# Altium footprint library En.PcbLib: 157 footprints (part 10 of 10)
Each footprint in its own frame and in the unit in brackets; x right, y up, seen from the top. Pads: shape width x height; smd on the part's side, far side on the other; paste and mask are expansions set on the pad; w line width, h text height; cw(c..) or ccw(c..) is an arc to the next point about the centre after c.
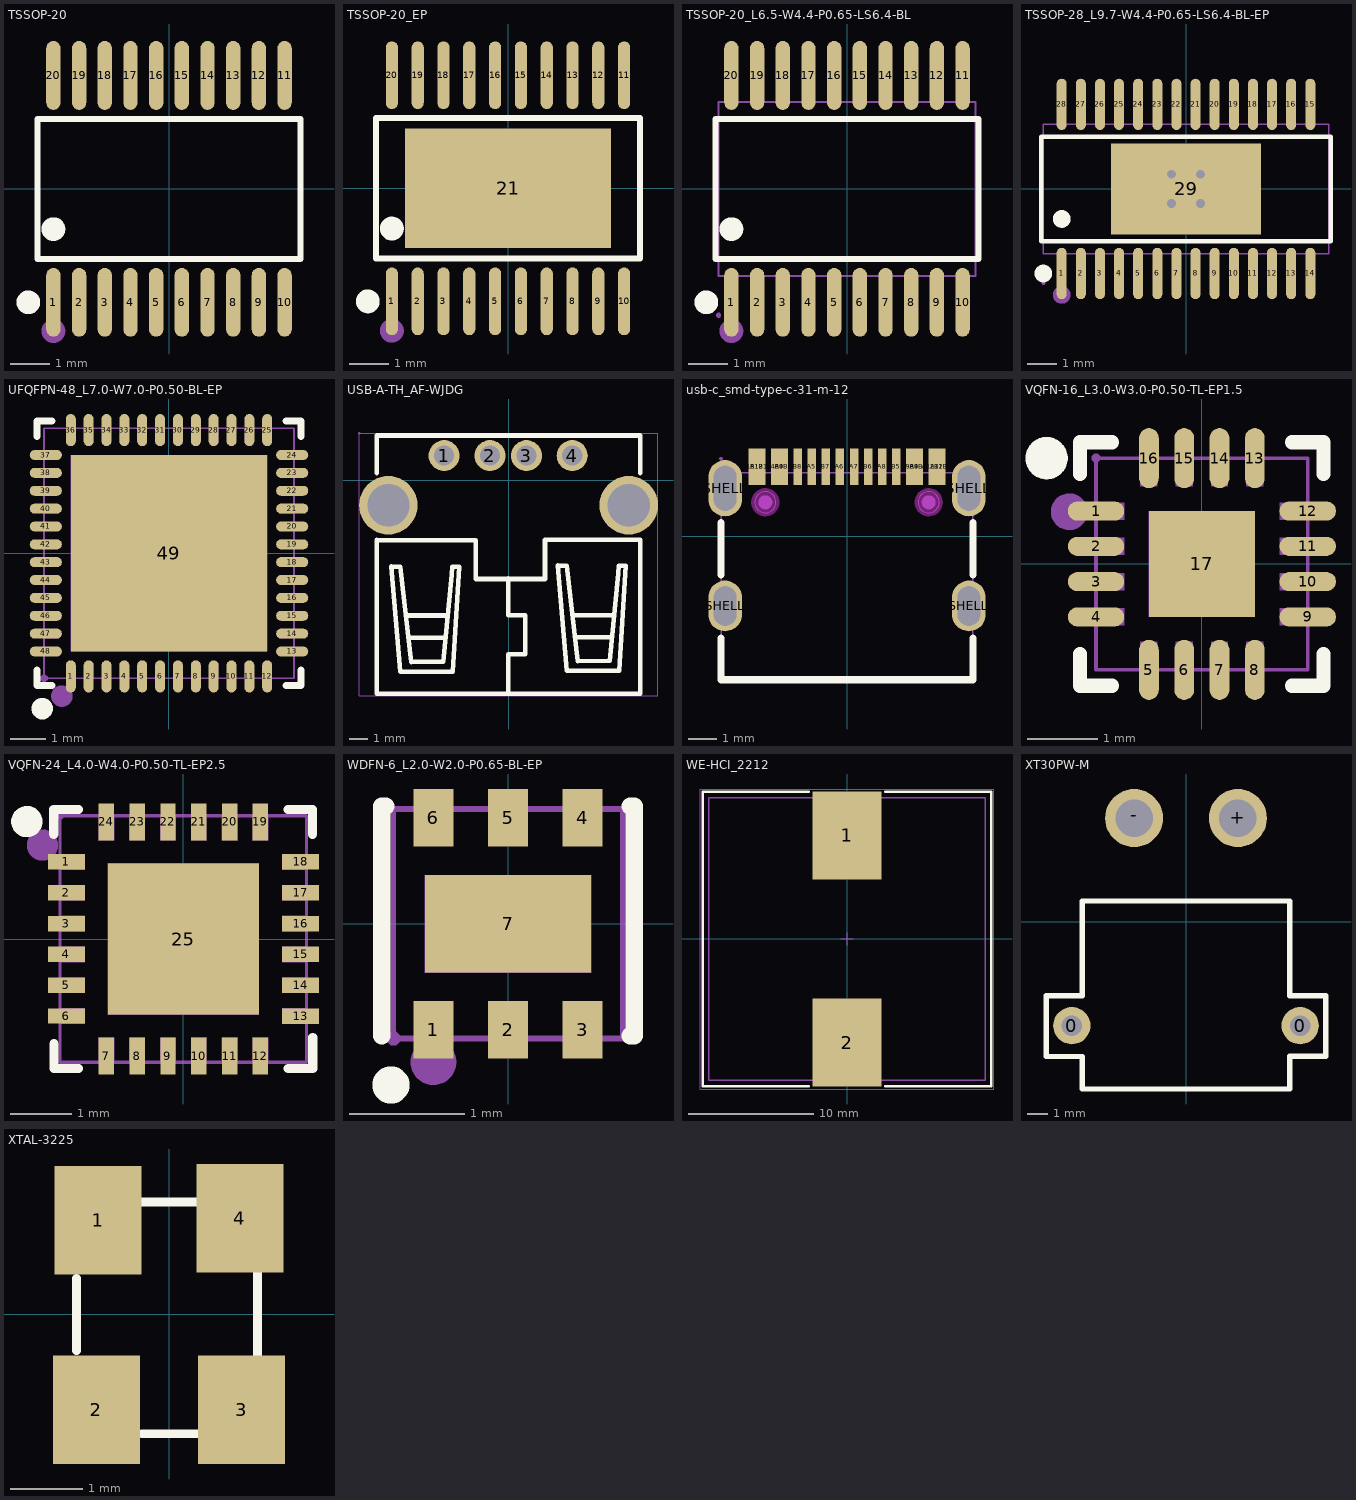
[diagram p9: the footprints below, top view; thin cyan lines are the x and y axes]

## TSSOP-20 [mm]
pads (20):
  oval 0.364x1.742 smd: 1(-2.925,-2.871) 2(-2.275,-2.871) 3(-1.625,-2.871) 4(-0.975,-2.871) 5(-0.325,-2.871) 6(0.325,-2.871) 7(0.975,-2.871) 8(1.625,-2.871) 9(2.275,-2.871) 10(2.925,-2.871) 11(2.925,2.871) 12(2.275,2.871) 13(1.625,2.871) 14(0.975,2.871) 15(0.325,2.871) 16(-0.325,2.871) 17(-0.975,2.871) 18(-1.625,2.871) 19(-2.275,2.871) 20(-2.925,2.871)
Top Overlay:
  circle w0.3: c-2.925,-1.019 r0.15
  circle w0.3: c-3.559,-2.871 r0.15
  lines w0.152: -3.326,-1.771 -3.326,1.771 3.326,1.771 3.326,-1.771 -3.326,-1.771
Mechanical 15:
  circle w0.3: c-2.925,-3.6 r0.15
3D body "User Library-tssop-20-1.SLDPRT": height 1.2, standoff 0, extent -3.3,-3.3 3.3,3.3

## TSSOP-20_EP [mm]
pads (21):
  oval 0.308x1.706 smd: 1(-2.925,-2.848) 2(-2.275,-2.848) 3(-1.625,-2.848) 4(-0.975,-2.848) 5(-0.325,-2.848) 6(0.325,-2.848) 7(0.975,-2.848) 8(1.625,-2.848) 9(2.275,-2.848) 10(2.925,-2.848) 11(2.925,2.848) 12(2.275,2.848) 13(1.625,2.848) 14(0.975,2.848) 15(0.325,2.848) 16(-0.325,2.848) 17(-0.975,2.848) 18(-1.625,2.848) 19(-2.275,2.848) 20(-2.925,2.848)
  rect 5.2x3 smd: 21(0,0)
Top Overlay:
  circle w0.3: c-2.925,-1.014 r0.15
  circle w0.3: c-3.531,-2.848 r0.15
  lines w0.152: -3.326,-1.766 -3.326,1.766 3.326,1.766 3.326,-1.766 -3.326,-1.766
Mechanical 15:
  circle w0.3: c-2.925,-3.587 r0.15
3D body "User Library-tssop-20-1.SLDPRT": height 1.2, standoff 0, extent -3.3,-3.3 3.3,3.3

## TSSOP-20_L6.5-W4.4-P0.65-LS6.4-BL [mm]
pads (20):
  oval 0.364x1.742 smd: 1(-2.925,-2.871) 2(-2.275,-2.871) 3(-1.625,-2.871) 4(-0.975,-2.871) 5(-0.325,-2.871) 6(0.325,-2.871) 7(0.975,-2.871) 8(1.625,-2.871) 9(2.275,-2.871) 10(2.925,-2.871) 11(2.925,2.871) 12(2.275,2.871) 13(1.625,2.871) 14(0.975,2.871) 15(0.325,2.871) 16(-0.325,2.871) 17(-0.975,2.871) 18(-1.625,2.871) 19(-2.275,2.871) 20(-2.925,2.871)
Top Overlay:
  circle w0.3: c-3.559,-2.871 r0.15
  circle w0.3: c-2.925,-1.019 r0.15
  lines w0.152: -3.326,-1.771 3.326,-1.771 3.326,1.771 -3.326,1.771 -3.326,-1.771
Mechanical 6:
  circle w0.3: c-2.925,-3.6 r0.15
Mechanical 15:
  drawing of 45 lines, arcs and shapes, not listed
3D body "User Library-tssop-20-1.SLDPRT": height 1.2, standoff 0, extent -3.3,-3.3 3.3,3.3

## TSSOP-28_L9.7-W4.4-P0.65-LS6.4-BL-EP [mm]
pads (29):
  oval 0.343x1.747 smd: 1(-4.225,-2.873) 2(-3.575,-2.873) 3(-2.925,-2.873) 4(-2.275,-2.873) 5(-1.625,-2.873) 6(-0.975,-2.873) 7(-0.325,-2.873) 8(0.325,-2.873) 9(0.975,-2.873) 10(1.625,-2.873) 11(2.275,-2.873) 12(2.925,-2.873) 13(3.575,-2.873) 14(4.225,-2.873) 15(4.225,2.873) 16(3.575,2.873) 17(2.925,2.873) 18(2.275,2.873) 19(1.625,2.873) 20(0.975,2.873) 21(0.325,2.873) 22(-0.325,2.873) 23(-0.975,2.873) 24(-1.625,2.873) 25(-2.275,2.873) 26(-2.925,2.873) 27(-3.575,2.873) 28(-4.225,2.873)
  rect 5.1x3.1 smd: 29(0,0)
via 0.5,0.5 diameter 0.61 hole 0.305
via -0.5,0.5 diameter 0.61 hole 0.305
via -0.5,-0.5 diameter 0.61 hole 0.305
via 0.5,-0.5 diameter 0.61 hole 0.305
Top Overlay:
  circle w0.3: c-4.225,-1.019 r0.15
  circle w0.3: c-4.849,-2.873 r0.15
  lines w0.152: -4.926,-1.771 -4.926,1.771 4.926,1.771 4.926,-1.771 -4.926,-1.771
Mechanical 6:
  circle w0.3: c-4.225,-3.6 r0.15
Mechanical 15:
  drawing of 62 lines, arcs and shapes, not listed
3D body "User Library-tssop28.SLDPRT": height 1.2, standoff 0, extent -4.9,-3.2 4.9,3.2

## UFQFPN-48_L7.0-W7.0-P0.50-BL-EP [mm]
pads (49):
  oval 0.28x0.9 smd: 1(-2.751,-3.449) 2(-2.25,-3.449) 3(-1.75,-3.449) 4(-1.25,-3.449) 5(-0.749,-3.449) 6(-0.249,-3.449) 7(0.249,-3.449) 8(0.749,-3.449) 9(1.25,-3.449) 10(1.75,-3.449) 11(2.251,-3.449) 12(2.751,-3.449) 25(2.751,3.449) 26(2.251,3.449) 27(1.75,3.449) 28(1.25,3.449) 29(0.749,3.449) 30(0.249,3.449) 31(-0.249,3.449) 32(-0.749,3.449) 33(-1.25,3.449) 34(-1.75,3.449) 35(-2.25,3.449) 36(-2.751,3.449)
  oval 0.9x0.28 smd: 13(3.449,-2.751) 14(3.449,-2.251) 15(3.449,-1.75) 16(3.449,-1.25) 17(3.449,-0.749) 18(3.449,-0.249) 19(3.449,0.249) 20(3.449,0.749) 21(3.449,1.25) 22(3.449,1.75) 23(3.449,2.25) 24(3.449,2.751) 37(-3.449,2.751) 38(-3.449,2.25) 39(-3.449,1.75) 40(-3.449,1.25) 41(-3.449,0.749) 42(-3.449,0.249) 43(-3.449,-0.249) 44(-3.449,-0.749) 45(-3.449,-1.25) 46(-3.449,-1.75) 47(-3.449,-2.251) 48(-3.449,-2.751)
  rect 5.5x5.5 smd: 49(0,0)
Top Overlay:
  lines w0.2: -3.7,-3.275 -3.7,-3.7 -3.275,-3.7 ; -3.7,3.275 -3.7,3.7 -3.275,3.7 ; 3.275,-3.7 3.7,-3.7 3.7,-3.275 ; 3.275,3.7 3.7,3.7 3.7,3.275
  lines w0.3: -3.551,-4.201 ccw(c-3.55,-4.351) -3.55,-4.501 ccw(c-3.55,-4.351) -3.548,-4.201
Mechanical 6:
  circle w0.3: c-3,-4 r0.15
Mechanical 15:
  drawing of 54 lines, arcs and shapes, not listed
3D body "stm32g431cbu6.step": height 0.61, standoff 0, extent -3.512,-3.51 3.515,3.517

## USB-A-TH_AF-WJDG [mm]
pads (6):
  round 1.7 hole 1.1: 1(-3.52,1.355) 2(-1.019,1.355) 3(0.98,1.355) 4(3.48,1.355)
  round 3.2 hole 2.3: ""(-6.57,-1.355) ""(6.57,-1.355)
Top Overlay:
  lines w0.254: -7.199,-3.236 -7.199,-11.655 7.201,-11.655 7.201,-3.236 ; -7.199,0.404 -7.199,2.46 7.201,2.46 7.201,0.404 ; -7.19,-3.266 -1.79,-3.266 -1.79,-5.385 1.99,-5.385 1.99,-3.245 7.19,-3.245 ; -5.609,-7.385 -3.349,-7.385 ; -5.469,-8.595 -3.439,-8.595 ; -0.01,-11.525 -0.01,-9.495 0.91,-9.495 0.91,-7.375 -0.01,-7.375 -0.01,-5.355 ; 3.49,-7.366 5.75,-7.366 ; 3.63,-8.576 5.66,-8.576 ; -6.42,-4.706 -5.911,-4.709 -5.401,-9.25 -5.325,-9.928 -3.576,-9.917 -3.102,-5.139 -3.072,-4.709 -2.691,-4.709 -3.041,-10.452 -5.925,-10.441 -6.42,-4.706 ; 2.682,-4.652 3.19,-4.656 3.701,-9.196 3.776,-9.874 5.526,-9.864 6,-5.085 6.03,-4.655 6.41,-4.655 6.06,-10.398 3.177,-10.387 2.682,-4.652
Mechanical 15:
  region: -8.11,2.587 -8.11,2.612 -8.145,2.647 -8.195,2.648 -8.23,2.612 -8.23,2.588 -8.23,2.563 -8.195,2.528 -8.145,2.527 -8.11,2.563
  region: 7.62,-1.355 7.619,-1.218 7.545,-0.953 7.406,-0.716 7.211,-0.523 6.973,-0.386 6.707,-0.316 6.433,-0.316 6.167,-0.386 5.929,-0.523 5.734,-0.716 5.595,-0.953 5.522,-1.217 5.52,-1.355 5.522,-1.492 5.595,-1.757 5.734,-1.994 5.929,-2.187 6.167,-2.323 6.433,-2.394 6.707,-2.394 6.973,-2.323 7.211,-2.187 7.406,-1.994 7.545,-1.757 7.619,-1.492
  region: -5.52,-1.355 -5.521,-1.218 -5.595,-0.953 -5.734,-0.716 -5.929,-0.523 -6.167,-0.386 -6.433,-0.316 -6.707,-0.316 -6.973,-0.386 -7.211,-0.523 -7.406,-0.716 -7.545,-0.953 -7.618,-1.217 -7.62,-1.355 -7.618,-1.492 -7.545,-1.757 -7.406,-1.994 -7.211,-2.187 -6.973,-2.323 -6.707,-2.394 -6.433,-2.394 -6.167,-2.323 -5.929,-2.187 -5.734,-1.994 -5.595,-1.757 -5.521,-1.492
  region: -3.07,1.355 -3.071,1.444 -3.141,1.607 -3.267,1.732 -3.432,1.8 -3.609,1.8 -3.773,1.732 -3.9,1.607 -3.969,1.444 -3.97,1.355 -3.969,1.266 -3.9,1.103 -3.774,0.978 -3.609,0.91 -3.432,0.91 -3.267,0.978 -3.141,1.103 -3.072,1.266
  region: -0.569,1.355 -0.57,1.444 -0.639,1.607 -0.765,1.732 -0.93,1.8 -1.107,1.8 -1.272,1.732 -1.398,1.607 -1.467,1.444 -1.468,1.355 -1.467,1.266 -1.398,1.103 -1.272,0.978 -1.107,0.91 -0.93,0.91 -0.765,0.978 -0.639,1.103 -0.57,1.266
  region: 1.43,1.355 1.429,1.444 1.36,1.607 1.234,1.732 1.069,1.8 0.892,1.8 0.727,1.732 0.601,1.607 0.532,1.444 0.531,1.355 0.532,1.266 0.601,1.103 0.727,0.978 0.892,0.91 1.069,0.91 1.234,0.978 1.36,1.103 1.429,1.266
  region: 3.93,1.355 3.929,1.444 3.859,1.607 3.733,1.732 3.569,1.8 3.391,1.8 3.227,1.732 3.1,1.607 3.031,1.444 3.03,1.355 3.031,1.266 3.1,1.103 3.227,0.978 3.391,0.91 3.569,0.91 3.733,0.978 3.859,1.103 3.929,1.266
  lines w0.051: -8.17,-11.782 -8.17,2.587 8.17,2.587 8.17,-11.782 -8.17,-11.782
3D body "User Library-USB-A-01.SLDPRT": height 6.95, standoff -4.2, extent -7.9,-11.16 7.9,2.54

## usb-c_smd-type-c-31-m-12 [mm]
pads (20):
  rect 0.3x1.3 smd paste-100 mask+0.051: A1B12(-3.35,2.474) A1B12(-3.05,2.474) A4B9(-2.55,2.474) A4B9(-2.25,2.474) A5(-1.25,2.474) A6(-0.25,2.474) A7(0.25,2.474) A8(1.25,2.474) A9B4(2.25,2.474) A9B4(2.55,2.474) A12B1(3.05,2.474) A12B1(3.35,2.474) B5(1.75,2.474) B6(0.75,2.474) B7(-0.75,2.474) B8(-1.75,2.474)
  oval 1.2x1.8 hole 0.8 slot 1.4 at 90 deg: SHELL(-4.325,-2.474) SHELL(4.325,-2.474)
  oval 1.2x2 hole 0.8 slot 1.6 at 90 deg: SHELL(-4.325,1.706) SHELL(4.325,1.706)
Top Overlay:
  lines w0.254: -4.469,-3.613 -4.469,-5.094 4.471,-5.094 4.471,-3.612 ; -4.469,-1.376 -4.469,0.487 ; 4.471,-1.376 4.471,0.488
Top Paste:
  drawing of 16 lines, arcs and shapes, not listed
Keep-Out Layer:
  board cut-out: -2.525,1.206 -2.525,1.28 -2.582,1.418 -2.688,1.524 -2.825,1.581 -2.975,1.581 -3.112,1.524 -3.218,1.418 -3.275,1.28 -3.275,1.206 -3.275,1.131 -3.218,0.993 -3.112,0.888 -2.975,0.831 -2.825,0.831 -2.688,0.888 -2.582,0.993 -2.525,1.131
  board cut-out: 3.275,1.206 3.275,1.28 3.218,1.418 3.112,1.524 2.974,1.581 2.825,1.581 2.687,1.524 2.582,1.418 2.525,1.28 2.525,1.206 2.525,1.131 2.582,0.993 2.687,0.888 2.825,0.831 2.974,0.831 3.112,0.888 3.218,0.993 3.275,1.131
Mechanical 1:
  circle w0.025: c-2.9,1.206 r0.375
  circle w0.025: c2.9,1.206 r0.375
Mechanical 6:
  circle w0.25: c2.9,1.206 r0.125
  circle w0.25: c-2.9,1.206 r0.125
Mechanical 15:
  region: -4.415,2.756 -4.416,2.78 -4.451,2.813 -4.499,2.813 -4.534,2.78 -4.535,2.756 -4.534,2.732 -4.499,2.699 -4.451,2.699 -4.416,2.732
  region: -4.475,-2.074 -4.175,-2.074 -4.175,-2.874 -4.475,-2.874
  region: 4.175,-2.074 4.475,-2.074 4.475,-2.874 4.175,-2.874
  region: 4.175,2.256 4.475,2.256 4.475,1.156 4.175,1.156
  region: -4.475,2.256 -4.175,2.256 -4.175,1.156 -4.475,1.156
  region: 3.21,2.756 3.41,2.756 3.41,2.056 3.21,2.056
  region: 3.01,2.756 3.21,2.756 3.21,2.056 3.01,2.056
  region: 1.65,2.756 1.85,2.756 1.85,2.056 1.65,2.056
  region: 1.15,2.756 1.35,2.756 1.35,2.056 1.15,2.056
  region: 0.65,2.756 0.85,2.756 0.85,2.056 0.65,2.056
  region: 0.15,2.756 0.35,2.756 0.35,2.056 0.15,2.056
  region: -0.35,2.756 -0.15,2.756 -0.15,2.056 -0.35,2.056
  region: -0.85,2.756 -0.65,2.756 -0.65,2.056 -0.85,2.056
  region: -1.35,2.756 -1.15,2.756 -1.15,2.056 -1.35,2.056
  region: -1.85,2.756 -1.65,2.756 -1.65,2.056 -1.85,2.056
  region: 2.41,2.756 2.61,2.756 2.61,2.056 2.41,2.056
  region: 2.21,2.756 2.41,2.756 2.41,2.056 2.21,2.056
  region: -2.41,2.756 -2.21,2.756 -2.21,2.056 -2.41,2.056
  region: -2.61,2.756 -2.41,2.756 -2.41,2.056 -2.61,2.056
  region: -3.21,2.756 -3.01,2.756 -3.01,2.056 -3.21,2.056
  region: -3.41,2.756 -3.21,2.756 -3.21,2.056 -3.41,2.056
  lines w0.051: -4.47,-5.094 -4.47,2.256 4.47,2.256 4.47,-5.094 -4.47,-5.094
Multi-Layer keep-out:
  circle w0.254: c-2.9,1.206 r0.375
  circle w0.254: c2.9,1.206 r0.375
3D body "type-c 16pin 2md(073).step": height 3.26, standoff -0.9, extent -4.445,-4.971 4.495,2.609

## VQFN-16_L3.0-W3.0-P0.50-TL-EP1.5 [mm]
pads (17):
  oval 0.8x0.27 smd paste-100 mask+0.051: 1(-1.5,0.75) 2(-1.5,0.25) 3(-1.5,-0.25) 4(-1.5,-0.75) 9(1.5,-0.75) 10(1.5,-0.25) 11(1.5,0.25) 12(1.5,0.75)
  oval 0.28x0.85 smd paste-100 mask+0.051: 5(-0.75,-1.5) 6(-0.25,-1.5) 7(0.25,-1.5) 8(0.75,-1.5) 13(0.75,1.5) 14(0.25,1.5) 15(-0.25,1.5) 16(-0.75,1.5)
  rect 1.5x1.5 smd paste-100 mask+0.051: 17(0,0)
Top Overlay:
  lines w0.2: -1.725,-1.275 -1.725,-1.725 -1.275,-1.725 ; -1.725,1.275 -1.725,1.725 -1.275,1.725 ; 1.275,-1.725 1.725,-1.725 1.725,-1.275 ; 1.275,1.725 1.725,1.725 1.725,1.275
  lines w0.3: -2.05,1.498 cw(c-2.2,1.499) -2.35,1.499 cw(c-2.2,1.499) -2.05,1.5
Top Paste:
  drawing of 17 lines, arcs and shapes, not listed
Mechanical 6:
  circle w0.26: c-1.88,0.74 r0.13
Mechanical 15:
  region: -0.75,0.75 0.75,0.75 0.75,-0.75 -0.75,-0.75
  region: 1.5,0.87 1.5,0.63 1.1,0.63 1.1,0.87
  region: 1.5,0.37 1.5,0.13 1.1,0.13 1.1,0.37
  region: 1.5,-0.13 1.5,-0.37 1.1,-0.37 1.1,-0.13
  region: 1.5,-0.63 1.5,-0.87 1.1,-0.87 1.1,-0.63
  region: -0.87,1.5 -0.63,1.5 -0.63,1.1 -0.87,1.1
  region: -0.37,1.5 -0.13,1.5 -0.13,1.1 -0.37,1.1
  region: 0.13,1.5 0.37,1.5 0.37,1.1 0.13,1.1
  region: 0.63,1.5 0.87,1.5 0.87,1.1 0.63,1.1
  region: -1.1,-0.63 -1.1,-0.87 -1.5,-0.87 -1.5,-0.63
  region: -1.1,-0.13 -1.1,-0.37 -1.5,-0.37 -1.5,-0.13
  region: -1.1,0.37 -1.1,0.13 -1.5,0.13 -1.5,0.37
  region: -1.1,0.87 -1.1,0.63 -1.5,0.63 -1.5,0.87
  region: 0.63,-1.1 0.87,-1.1 0.87,-1.5 0.63,-1.5
  region: 0.13,-1.1 0.37,-1.1 0.37,-1.5 0.13,-1.5
  region: -0.37,-1.1 -0.13,-1.1 -0.13,-1.5 -0.37,-1.5
  region: -0.87,-1.1 -0.63,-1.1 -0.63,-1.5 -0.87,-1.5
  region: -1.44,1.5 -1.441,1.524 -1.475,1.559 -1.524,1.559 -1.559,1.525 -1.56,1.5 -1.559,1.476 -1.524,1.441 -1.476,1.441 -1.441,1.476
  lines w0.051: -1.5,-1.5 -1.5,1.5 1.5,1.5 1.5,-1.5 -1.5,-1.5
3D body "ma730gq-p.step": height 0.81, standoff -0.02, extent -1.51,-1.51 1.51,1.51

## VQFN-24_L4.0-W4.0-P0.50-TL-EP2.5 [mm]
pads (25):
  rect 0.6x0.25 smd paste-100 mask+0.05: 1(-1.9,1.25) 2(-1.9,0.75) 3(-1.9,0.25) 4(-1.9,-0.25) 5(-1.9,-0.75) 6(-1.9,-1.25) 13(1.9,-1.25) 14(1.9,-0.75) 15(1.9,-0.25) 16(1.9,0.25) 17(1.9,0.75) 18(1.9,1.25)
  rect 0.25x0.6 smd paste-100 mask+0.05: 7(-1.25,-1.9) 8(-0.75,-1.9) 9(-0.25,-1.9) 10(0.25,-1.9) 11(0.75,-1.9) 12(1.25,-1.9) 19(1.25,1.9) 20(0.75,1.9) 21(0.25,1.9) 22(-0.25,1.9) 23(-0.75,1.9) 24(-1.25,1.9)
  rect 2.45x2.45 smd paste-100 mask+0.05: 25(0,0)
Top Overlay:
  circle w0.254: c-2.54,1.905 r0.127
  lines w0.15: -2.104,1.7 -2.104,2.1 -1.7,2.1 ; -2.1,-1.7 -2.1,-2.1 -1.7,-2.1 ; 1.695,2.1 2.095,2.1 2.095,1.7 ; 1.7,-2.1 2.1,-2.1 2.1,-1.6
Top Paste:
  region: -1.375,2.2 -1.125,2.2 -1.125,1.6 -1.375,1.6
  region: -0.875,2.2 -0.625,2.2 -0.625,1.6 -0.875,1.6
  region: -0.375,2.2 -0.125,2.2 -0.125,1.6 -0.375,1.6
  region: 0.125,2.2 0.375,2.2 0.375,1.6 0.125,1.6
  region: 0.625,2.2 0.875,2.2 0.875,1.6 0.625,1.6
  region: 1.125,2.2 1.375,2.2 1.375,1.6 1.125,1.6
  region: 1.6,1.375 2.2,1.375 2.2,1.125 1.6,1.125
  region: 1.6,0.875 2.2,0.875 2.2,0.625 1.6,0.625
  region: 1.6,0.375 2.2,0.375 2.2,0.125 1.6,0.125
  region: 1.6,-0.125 2.2,-0.125 2.2,-0.375 1.6,-0.375
  region: 1.6,-0.625 2.2,-0.625 2.2,-0.875 1.6,-0.875
  region: 1.6,-1.125 2.2,-1.125 2.2,-1.375 1.6,-1.375
  region: 1.125,-1.6 1.375,-1.6 1.375,-2.2 1.125,-2.2
  region: 0.625,-1.6 0.875,-1.6 0.875,-2.2 0.625,-2.2
  region: 0.125,-1.6 0.375,-1.6 0.375,-2.2 0.125,-2.2
  region: -0.375,-1.6 -0.125,-1.6 -0.125,-2.2 -0.375,-2.2
  region: -0.875,-1.6 -0.625,-1.6 -0.625,-2.2 -0.875,-2.2
  region: -1.375,-1.6 -1.125,-1.6 -1.125,-2.2 -1.375,-2.2
  region: -2.2,-1.125 -1.6,-1.125 -1.6,-1.375 -2.2,-1.375
  region: -2.2,-0.625 -1.6,-0.625 -1.6,-0.875 -2.2,-0.875
  region: -2.2,-0.125 -1.6,-0.125 -1.6,-0.375 -2.2,-0.375
  region: -2.2,0.375 -1.6,0.375 -1.6,0.125 -2.2,0.125
  region: -2.2,0.875 -1.6,0.875 -1.6,0.625 -2.2,0.625
  region: -2.2,1.375 -1.6,1.375 -1.6,1.125 -2.2,1.125
  region: -0.98,0.98 0.98,0.98 0.98,-0.98 -0.98,-0.98
Mechanical 6:
  circle w0.254: c-2.286,1.524 r0.127
Mechanical 15:
  region: -1.225,1.225 1.225,1.225 1.225,-1.225 -1.225,-1.225
  region: -2,1.375 -1.6,1.375 -1.6,1.125 -2,1.125
  region: -2,0.875 -1.6,0.875 -1.6,0.625 -2,0.625
  region: -2,0.375 -1.6,0.375 -1.6,0.125 -2,0.125
  region: -2,-0.125 -1.6,-0.125 -1.6,-0.375 -2,-0.375
  region: -2,-0.625 -1.6,-0.625 -1.6,-0.875 -2,-0.875
  region: -2,-1.125 -1.6,-1.125 -1.6,-1.375 -2,-1.375
  region: -1.375,-1.6 -1.125,-1.6 -1.125,-2 -1.375,-2
  region: -0.875,-1.6 -0.625,-1.6 -0.625,-2 -0.875,-2
  region: -0.375,-1.6 -0.125,-1.6 -0.125,-2 -0.375,-2
  region: 0.125,-1.6 0.375,-1.6 0.375,-2 0.125,-2
  region: 0.625,-1.6 0.875,-1.6 0.875,-2 0.625,-2
  region: 1.125,-1.6 1.375,-1.6 1.375,-2 1.125,-2
  region: 1.6,-1.125 2,-1.125 2,-1.375 1.6,-1.375
  region: 1.6,-0.625 2,-0.625 2,-0.875 1.6,-0.875
  region: 1.6,-0.125 2,-0.125 2,-0.375 1.6,-0.375
  region: 1.6,0.375 2,0.375 2,0.125 1.6,0.125
  region: 1.6,0.875 2,0.875 2,0.625 1.6,0.625
  region: 1.6,1.375 2,1.375 2,1.125 1.6,1.125
  region: 1.125,2 1.375,2 1.375,1.6 1.125,1.6
  region: 0.625,2 0.875,2 0.875,1.6 0.625,1.6
  region: 0.125,2 0.375,2 0.375,1.6 0.125,1.6
  region: -0.375,2 -0.125,2 -0.125,1.6 -0.375,1.6
  region: -0.875,2 -0.625,2 -0.625,1.6 -0.875,1.6
  region: -1.375,2 -1.125,2 -1.125,1.6 -1.375,1.6
  region: -1.94,2 -1.941,2.024 -1.976,2.057 -2.024,2.057 -2.059,2.024 -2.06,2 -2.059,1.976 -2.024,1.943 -1.976,1.943 -1.941,1.976
  lines w0.051: -2,-2 2,-2 2,2 -2,2 -2,-2
3D body "lm5141qrgetq1.step": height 1, standoff -0.02, extent -2.01,-2.01 2.01,2.01

## WDFN-6_L2.0-W2.0-P0.65-BL-EP [mm]
pads (7):
  rect 0.35x0.5 smd: 1(-0.65,-0.925) 2(0,-0.925) 3(0.65,-0.925) 4(0.65,0.925) 5(0,0.925) 6(-0.65,0.925)
  rect 1.45x0.85 smd: 7(0,0)
Top Overlay:
  circle w0.254: c-1.02,-1.405 r0.035
  lines w0.152: -1.1,-0.975 -1.1,1.025 -1.066,1.025 ; 1.066,-0.975 1.1,-0.975 1.1,1.025 1.066,1.025
Mechanical 6:
  circle w0.2: c-0.65,-1.205 r0.1
Mechanical 15:
  region: -0.8,-0.75 -0.5,-0.75 -0.5,-1 -0.8,-1
  region: -0.15,-0.75 0.15,-0.75 0.15,-1 -0.15,-1
  region: 0.5,-0.75 0.8,-0.75 0.8,-1 0.5,-1
  region: 0.5,1 0.8,1 0.8,0.75 0.5,0.75
  region: -0.15,1 0.15,1 0.15,0.75 -0.15,0.75
  region: -0.8,1 -0.5,1 -0.5,0.75 -0.8,0.75
  region: 0.725,-0.425 -0.725,-0.425 -0.725,0.425 0.725,0.425
  region: -0.94,-1 -0.941,-0.976 -0.976,-0.942 -1.024,-0.942 -1.059,-0.976 -1.06,-1 -1.059,-1.024 -1.024,-1.057 -0.976,-1.057 -0.941,-1.024
  lines w0.051: -1,-1 -1,1 1,1 1,-1 -1,-1
3D body "User Library-LT3008 DFN6.SLDPRT": height 0.75, standoff -0.01, extent -1,-1.001 1,1.001

## WE-HCI_2212 [mm] "SMT Flat Wire High Current Inductor, body 22x22.5mm"
height 12
pads (2):
  rect 5.5x7 smd: 1(0,8.25) 2(0,-8.25)
Top Overlay:
  lines w0.2: -3.05,-11.75 -11.5,-11.75 -11.5,11.75 -3.05,11.75 ; 3.05,-11.75 11.5,-11.75 11.5,11.75 3.05,11.75
Mechanical 13:
  lines w0.1: -11,-11.25 11,-11.25 11,11.25 -11,11.25 -11,-11.25
Mechanical 15:
  lines w0.05: -0.5,0 0.5,0 ; 0,-0.5 0,0.5 ; -11.7,-11.95 -11.7,11.95 11.7,11.95 11.7,-11.95 -11.7,-11.95
3D body "7443558xxxx.stp": height 12, standoff 0, extent -11,-11.25 11,11.25

## XT30PW-M [mm]
pads (4):
  round 1.8 hole 1: 0(-5.5,-5) 0(5.5,-5)
  round 2.8 hole 1.8: +(2.5,5) -(-2.5,5)
Top Overlay:
  lines w0.254: -6.731,-6.48 -5,-6.48 -5,-8.05 5,-8.05 5,-6.477 6.731,-6.477 6.731,-3.559 5,-3.559 5,1 -5,1 -5,-3.559 -6.731,-3.559 -6.731,-6.48
3D body "XT30PW-M.stp": height 5.29, standoff -2.21, extent -6.65,-8 6.65,5.95

## XTAL-3225 [mm]
pads (4):
  rect 1.2x1.5 smd: 1(-0.978,1.295) 2(-1.003,-1.321) 3(1.003,-1.321) 4(0.978,1.321)
Top Overlay:
  lines w0.12: -1.278,-0.505 -1.278,0.495 ; -0.378,-1.655 0.422,-1.655 ; -0.378,1.545 0.422,1.545 ; 1.222,-0.605 1.222,0.595
3D body "XTAL-3225.STEP": height 0.8, standoff 0, extent -1.268,-1.651 1.232,1.549